# Altium footprint library footprints.PcbLib: 25 footprints (part 2 of 2)
Each footprint in its own frame and in the unit in brackets; x right, y up, seen from the top. Pads: shape width x height; smd on the part's side, far side on the other; paste and mask are expansions set on the pad; w line width, h text height; cw(c..) or ccw(c..) is an arc to the next point about the centre after c.
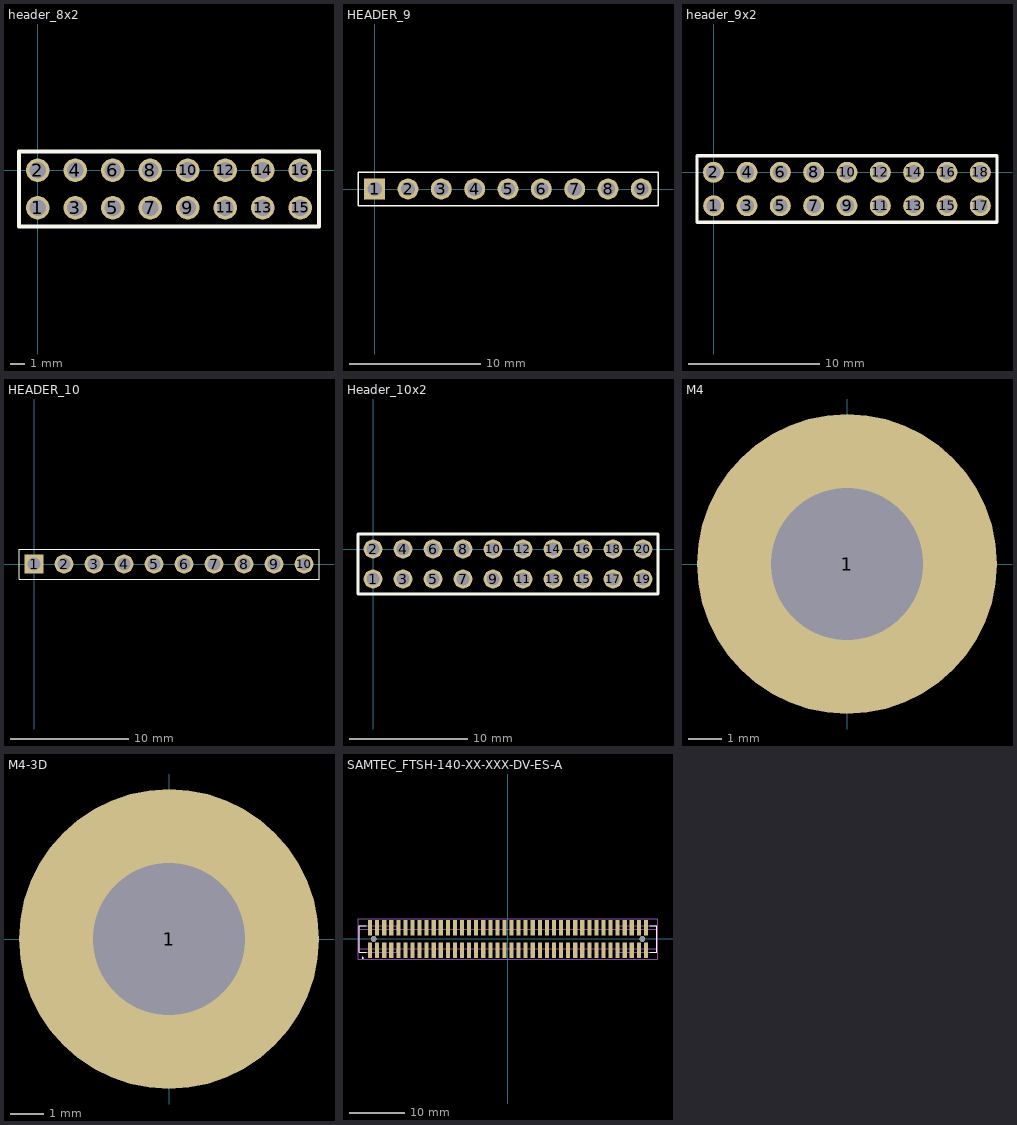
[diagram p1: the footprints below, top view; thin cyan lines are the x and y axes]

## header_8x2 [mm]
pads (16):
  round 1.6 hole 1.1: 1(0,-2.54) 2(0,0) 3(2.54,-2.54) 4(2.54,0) 5(5.08,-2.54) 6(5.08,0) 7(7.62,-2.54) 8(7.62,0) 9(10.16,-2.54) 10(10.16,0) 11(12.7,-2.54) 12(12.7,0) 13(15.24,-2.54) 14(15.24,0) 15(17.78,-2.54) 16(17.78,0)
Top Overlay:
  lines w0.254: -1.27,-3.81 19.05,-3.81 19.05,1.27 -1.27,1.27 -1.27,-3.81
3D body "Header 8x2.step": height 13.04, standoff -2.5, extent -1.27,-3.81 19.05,1.27

## HEADER_9 [mm]
pads (9):
  rect 1.6x1.6 hole 1.1: 1(0,0)
  round 1.6 hole 1.1: 2(2.54,0) 3(5.08,0) 4(7.62,0) 5(10.16,0) 6(12.7,0) 7(15.24,0) 8(17.78,0) 9(20.32,0)
Top Overlay:
  lines w0.1: -1.27,-1.27 21.59,-1.27 21.59,1.27 -1.27,1.27 -1.27,-1.27
3D body "Header 9.step": height 13.04, standoff -2.5, extent -1.27,-1.27 21.59,1.27

## header_9x2 [mm]
pads (18):
  round 1.6 hole 1.1: 1(0,-2.54) 2(-0.017,0) 3(2.54,-2.54) 4(2.54,0) 5(5.08,-2.54) 6(5.08,0) 7(7.62,-2.54) 8(7.62,0) 9(10.16,-2.54) 10(10.16,0) 11(12.7,-2.54) 12(12.7,0) 13(15.24,-2.54) 14(15.24,0) 15(17.78,-2.54) 16(17.78,0) 17(20.32,-2.54) 18(20.32,0)
Top Overlay:
  lines w0.254: -1.27,-3.81 -1.27,1.27 21.59,1.27 21.59,-3.81 -1.27,-3.81
3D body "Header 9x2.step": height 13.04, standoff -2.5, extent -1.27,-3.81 21.59,1.27

## HEADER_10 [mm]
pads (10):
  rect 1.6x1.6 hole 1.1: 1(0,0)
  round 1.6 hole 1.1: 2(2.54,0) 3(5.08,0) 4(7.62,0) 5(10.16,0) 6(12.7,0) 7(15.24,0) 8(17.78,0) 9(20.32,0) 10(22.86,0)
Top Overlay:
  lines w0.1: -1.27,-1.27 -1.27,1.27 24.13,1.27 24.13,-1.27 -1.27,-1.27
3D body "Header 10.step": height 13.04, standoff -2.5, extent -1.305,-1.29 24.095,1.25

## Header_10x2 [mm]
pads (20):
  round 1.6 hole 1.1: 1(0,-2.54) 2(0,0) 3(2.54,-2.54) 4(2.54,0) 5(5.08,-2.54) 6(5.08,0) 7(7.62,-2.54) 8(7.62,0) 9(10.16,-2.54) 10(10.16,0) 11(12.7,-2.54) 12(12.7,0) 13(15.24,-2.54) 14(15.24,0) 15(17.78,-2.54) 16(17.78,0) 17(20.32,-2.54) 18(20.32,0) 19(22.86,-2.54) 20(22.86,0)
Top Overlay:
  lines w0.254: -1.27,-3.81 24.13,-3.81 24.13,1.27 -1.27,1.27 -1.27,-3.81
3D body "Header 10x2.step": height 13.04, standoff -2.5, extent -1.27,-3.81 24.13,1.27

## M4 [mm]
pads (1):
  round 9 hole 4.55: 1(0,0)

## M4-3D [mm]
pads (1):
  round 9 hole 4.55: 1(0,0)
3D body "Nut M4.step": height 4, standoff 0, extent -3.5,-4.025 3.5,4.025
3D body "Screw M4.step": height 9.5, standoff -7.5, extent -3.5,-4.025 3.5,4.025

## PCBComponent_1 [mil]

## SAMTEC_FTSH-140-XX-XXX-DV-ES-A [mm]
height 4.83
pads (82):
  rect 0.74x2.79 smd: 01(-24.765,-2.035) 02(-24.765,2.035) 03(-23.495,-2.035) 04(-23.495,2.035) 05(-22.225,-2.035) 06(-22.225,2.035) 07(-20.955,-2.035) 08(-20.955,2.035) 09(-19.685,-2.035) 10(-19.685,2.035) 11(-18.415,-2.035) 12(-18.415,2.035) 13(-17.145,-2.035) 14(-17.145,2.035) 15(-15.875,-2.035) 16(-15.875,2.035) 17(-14.605,-2.035) 18(-14.605,2.035) 19(-13.335,-2.035) 20(-13.335,2.035) 21(-12.065,-2.035) 22(-12.065,2.035) 23(-10.795,-2.035) 24(-10.795,2.035) 25(-9.525,-2.035) 26(-9.525,2.035) 27(-8.255,-2.035) 28(-8.255,2.035) 29(-6.985,-2.035) 30(-6.985,2.035) 31(-5.715,-2.035) 32(-5.715,2.035) 33(-4.445,-2.035) 34(-4.445,2.035) 35(-3.175,-2.035) 36(-3.175,2.035) 37(-1.905,-2.035) 38(-1.905,2.035) 39(-0.635,-2.035) 40(-0.635,2.035) 41(0.635,-2.035) 42(0.635,2.035) 43(1.905,-2.035) 44(1.905,2.035) 45(3.175,-2.035) 46(3.175,2.035) 47(4.445,-2.035) 48(4.445,2.035) 49(5.715,-2.035) 50(5.715,2.035) 51(6.985,-2.035) 52(6.985,2.035) 53(8.255,-2.035) 54(8.255,2.035) 55(9.525,-2.035) 56(9.525,2.035) 57(10.795,-2.035) 58(10.795,2.035) 59(12.065,-2.035) 60(12.065,2.035) 61(13.335,-2.035) 62(13.335,2.035) 63(14.605,-2.035) 64(14.605,2.035) 65(15.875,-2.035) 66(15.875,2.035) 67(17.145,-2.035) 68(17.145,2.035) 69(18.415,-2.035) 70(18.415,2.035) 71(19.685,-2.035) 72(19.685,2.035) 73(20.955,-2.035) 74(20.955,2.035) 75(22.225,-2.035) 76(22.225,2.035) 77(23.495,-2.035) 78(23.495,2.035) 79(24.765,-2.035) 80(24.765,2.035)
  round 1.02 hole 1.02 unplated: ""(-24.13,0) ""(24.13,0)
Top Overlay:
  circle w0.2: c-26.115,-3.4 r0.1
  lines w0.2: -25.485,-2.39 -26.685,-2.39 -26.685,2.39 -25.485,2.39 ; 25.485,-2.39 26.685,-2.39 26.685,2.39 25.485,2.39
Mechanical 13:
  circle w0.2: c-26.115,-3.4 r0.1
  lines w0.1: -19.955,-1.715 -26.685,-1.715 -26.685,1.715 -19.955,1.715 ; -19.955,-1.715 19.955,-1.715 ; -19.955,-1.715 -19.955,-2.39 -26.685,-2.39 -26.685,2.39 -19.955,2.39 -19.955,1.715 ; -19.955,1.715 19.955,1.715 ; 19.955,-1.715 26.685,-1.715 26.685,1.715 19.955,1.715 ; 19.955,-1.715 19.955,-2.39 26.685,-2.39 26.685,2.39 19.955,2.39 19.955,1.715
Mechanical 15:
  lines w0.05: -26.935,-3.68 -26.935,3.68 26.935,3.68 26.935,-3.68 -26.935,-3.68
3D body "FTSH-140-02-L-DV-ES-A.stp": height 4.94, standoff -0.85, extent -26.683,-2.921 26.683,2.921